# Altium schematic symbol library Resistor - Current Sense.SchLib: 810 symbols (part 2 of 4) (continued)
## CSR2010FTR220 (continued)
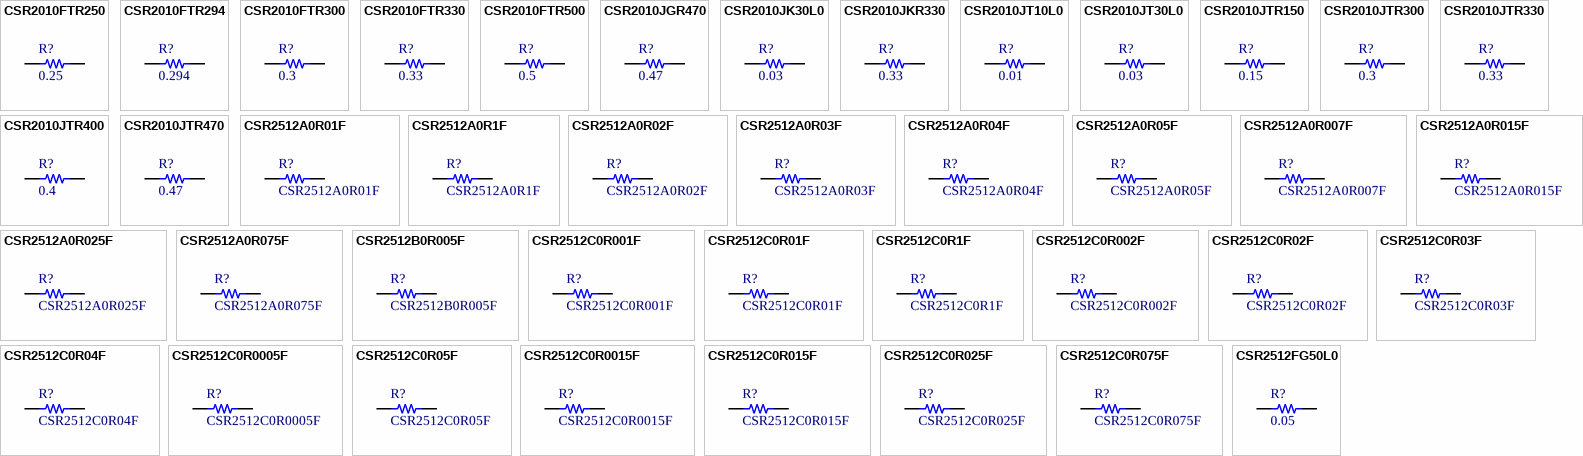
[diagram p6: symbols CSR2010FTR250 to CSR2512FG50L0]

## CSR2010FTR250
designator R?, comment 0.25
RES SMD 0.25 OHM 1% 1W 2010; Part Number: CSR2010FTR250; Manufacturer: Stackpole Electronics Inc.; TemperatureRange: -55C ~ 155C; TemperatureCoefficient: 100ppm/C; Value: 0.25; PartId: 10003; Supplier 1: Digi-Key; Supplier Part Number 1: CSR2010FTR250-ND; ComponentLink1Description: Datasheet; ComponentLink1URL: http://www.seielect.com/catalog/SEI-CSR_CSRN.pdf; ComponentLink2Description: Digi-Key Listing; ComponentLink2URL: https://www.digikey.com/product-detail/en/stackpole-electronics-inc/CSR2010FTR250/CSR2010FTR250-ND/1742345; Tolerance: 1%; PowerRating: 1W; Price: 0.1215; Device Package: 2010 (5025 Metric)
footprint STACKPOLE CSR2010
pins: 1, 2

## CSR2010FTR294
designator R?, comment 0.294
RES SMD 0.294 OHM 1% 1W 2010; Part Number: CSR2010FTR294; Manufacturer: Stackpole Electronics Inc.; TemperatureRange: -55C ~ 155C; TemperatureCoefficient: 100ppm/C; Value: 0.294; PartId: 10006; Supplier 1: Digi-Key; Supplier Part Number 1: CSR2010FTR294TR-ND; ComponentLink1Description: Datasheet; ComponentLink1URL: http://www.seielect.com/catalog/SEI-CSR_CSRN.pdf; ComponentLink2Description: Digi-Key Listing; ComponentLink2URL: https://www.digikey.com/product-detail/en/stackpole-electronics-inc/CSR2010FTR294/CSR2010FTR294TR-ND/2027022; Tolerance: 1%; PowerRating: 1W; Price: 0.1215; Device Package: 2010 (5025 Metric)
footprint STACKPOLE CSR2010
pins: 1, 2

## CSR2010FTR300
designator R?, comment 0.3
RES SMD 0.3 OHM 1% 1W 2010; Part Number: CSR2010FTR300; Manufacturer: Stackpole Electronics Inc.; TemperatureRange: -55C ~ 155C; TemperatureCoefficient: 100ppm/C; Value: 0.3; PartId: 10004; Supplier 1: Digi-Key; Supplier Part Number 1: CSR2010FTR300-ND; ComponentLink1Description: Datasheet; ComponentLink1URL: http://www.seielect.com/catalog/SEI-CSR_CSRN.pdf; ComponentLink2Description: Digi-Key Listing; ComponentLink2URL: https://www.digikey.com/product-detail/en/stackpole-electronics-inc/CSR2010FTR300/CSR2010FTR300-ND/1742347; Tolerance: 1%; PowerRating: 1W; Price: 0.1215; Device Package: 2010 (5025 Metric)
footprint STACKPOLE CSR2010
pins: 1, 2

## CSR2010FTR330
designator R?, comment 0.33
RES SMD 0.33 OHM 1% 1W 2010; Part Number: CSR2010FTR330; Manufacturer: Stackpole Electronics Inc.; TemperatureRange: -55C ~ 155C; TemperatureCoefficient: 100ppm/C; Value: 0.33; PartId: 10005; Supplier 1: Digi-Key; Supplier Part Number 1: CSR2010FTR330-ND; ComponentLink1Description: Datasheet; ComponentLink1URL: http://www.seielect.com/catalog/SEI-CSR_CSRN.pdf; ComponentLink2Description: Digi-Key Listing; ComponentLink2URL: https://www.digikey.com/product-detail/en/stackpole-electronics-inc/CSR2010FTR330/CSR2010FTR330-ND/1742349; Tolerance: 1%; PowerRating: 1W; Price: 0.1215; Device Package: 2010 (5025 Metric)
footprint STACKPOLE CSR2010
pins: 1, 2

## CSR2010FTR500
designator R?, comment 0.5
RES SMD 0.5 OHM 1% 1W 2010; Part Number: CSR2010FTR500; Manufacturer: Stackpole Electronics Inc.; TemperatureRange: -55C ~ 155C; TemperatureCoefficient: 100ppm/C; Value: 0.5; PartId: 9997; Supplier 1: Digi-Key; Supplier Part Number 1: CSR2010FTR500-ND; ComponentLink1Description: Datasheet; ComponentLink1URL: http://www.seielect.com/catalog/SEI-CSR_CSRN.pdf; ComponentLink2Description: Digi-Key Listing; ComponentLink2URL: https://www.digikey.com/product-detail/en/stackpole-electronics-inc/CSR2010FTR500/CSR2010FTR500-ND/1742355; Tolerance: 1%; PowerRating: 1W; Price: 0.0945; Device Package: 2010 (5025 Metric)
footprint STACKPOLE CSR2010
pins: 1, 2

## CSR2010JGR470
designator R?, comment 0.47
RES SMD 0.47 OHM 5% 1W 2010; Part Number: CSR2010JGR470; Manufacturer: Stackpole Electronics Inc.; TemperatureRange: -55C ~ 155C; TemperatureCoefficient: 100ppm/C; Value: 0.47; PartId: 9991; Supplier 1: Digi-Key; Supplier Part Number 1: CSR2010JGR470TR-ND; ComponentLink1Description: Datasheet; ComponentLink1URL: http://www.seielect.com/catalog/SEI-CSR_CSRN.pdf; ComponentLink2Description: Digi-Key Listing; ComponentLink2URL: https://www.digikey.com/product-detail/en/stackpole-electronics-inc/CSR2010JGR470/CSR2010JGR470TR-ND/2027023; Tolerance: 5%; PowerRating: 1W; Price: 0.0675; Device Package: 2010 (5025 Metric)
footprint STACKPOLE CSR2010
pins: 1, 2

## CSR2010JK30L0
designator R?, comment 0.03
RES SMD 0.03 OHM 5% 1W 2010; Part Number: CSR2010JK30L0; Manufacturer: Stackpole Electronics Inc.; TemperatureRange: -55C ~ 155C; Value: 0.03; PartId: 10007; Supplier 1: Digi-Key; Supplier Part Number 1: CSR2010JK30L0-ND; ComponentLink1Description: Datasheet; ComponentLink1URL: http://www.seielect.com/catalog/SEI-CSR_CSRN.pdf; ComponentLink2Description: Digi-Key Listing; ComponentLink2URL: https://www.digikey.com/product-detail/en/stackpole-electronics-inc/CSR2010JK30L0/CSR2010JK30L0-ND/1742322; Tolerance: 5%; PowerRating: 1W; Price: 0.126; Device Package: 2010 (5025 Metric)
footprint STACKPOLE CSR2010
pins: 1, 2

## CSR2010JKR330
designator R?, comment 0.33
RES SMD 0.33 OHM 5% 1W 2010; Part Number: CSR2010JKR330; Manufacturer: Stackpole Electronics Inc.; TemperatureRange: -55C ~ 155C; TemperatureCoefficient: 100ppm/C; Value: 0.33; PartId: 9996; Supplier 1: Digi-Key; Supplier Part Number 1: CSR2010JKR330-ND; ComponentLink1Description: Datasheet; ComponentLink1URL: http://www.seielect.com/catalog/SEI-CSR_CSRN.pdf; ComponentLink2Description: Digi-Key Listing; ComponentLink2URL: https://www.digikey.com/product-detail/en/stackpole-electronics-inc/CSR2010JKR330/CSR2010JKR330-ND/1742350; Tolerance: 5%; PowerRating: 1W; Price: 0.08; Device Package: 2010 (5025 Metric)
footprint STACKPOLE CSR2010
pins: 1, 2

## CSR2010JT10L0
designator R?, comment 0.01
RES SMD 0.01 OHM 5% 1W 2010; Part Number: CSR2010JT10L0; Manufacturer: Stackpole Electronics Inc.; TemperatureRange: -55C ~ 155C; Value: 0.01; PartId: 10012; Supplier 1: Digi-Key; Supplier Part Number 1: CSR2010JT10L0-ND; ComponentLink1Description: Datasheet; ComponentLink1URL: http://www.seielect.com/catalog/SEI-CSR_CSRN.pdf; ComponentLink2Description: Digi-Key Listing; ComponentLink2URL: https://www.digikey.com/product-detail/en/stackpole-electronics-inc/CSR2010JT10L0/CSR2010JT10L0-ND/1742312; Tolerance: 5%; PowerRating: 1W; Price: 0.1474; Device Package: 2010 (5025 Metric)
footprint STACKPOLE CSR2010
pins: 1, 2

## CSR2010JT30L0
designator R?, comment 0.03
RES SMD 0.03 OHM 5% 1W 2010; Part Number: CSR2010JT30L0; Manufacturer: Stackpole Electronics Inc.; TemperatureRange: -55C ~ 155C; Value: 0.03; PartId: 10000; Supplier 1: Digi-Key; Supplier Part Number 1: CSR2010JT30L0-ND; ComponentLink1Description: Datasheet; ComponentLink1URL: http://www.seielect.com/catalog/SEI-CSR_CSRN.pdf; ComponentLink2Description: Digi-Key Listing; ComponentLink2URL: https://www.digikey.com/product-detail/en/stackpole-electronics-inc/CSR2010JT30L0/CSR2010JT30L0-ND/1742323; Tolerance: 5%; PowerRating: 1W; Price: 0.1215; Device Package: 2010 (5025 Metric)
footprint STACKPOLE CSR2010
pins: 1, 2

## CSR2010JTR150
designator R?, comment 0.15
RES SMD 0.15 OHM 5% 1W 2010; Part Number: CSR2010JTR150; Manufacturer: Stackpole Electronics Inc.; TemperatureRange: -55C ~ 155C; TemperatureCoefficient: 100ppm/C; Value: 0.15; PartId: 9992; Supplier 1: Digi-Key; Supplier Part Number 1: CSR2010JTR150-ND; ComponentLink1Description: Datasheet; ComponentLink1URL: http://www.seielect.com/catalog/SEI-CSR_CSRN.pdf; ComponentLink2Description: Digi-Key Listing; ComponentLink2URL: https://www.digikey.com/product-detail/en/stackpole-electronics-inc/CSR2010JTR150/CSR2010JTR150-ND/1742340; Tolerance: 5%; PowerRating: 1W; Price: 0.075; Device Package: 2010 (5025 Metric)
footprint STACKPOLE CSR2010
pins: 1, 2

## CSR2010JTR300
designator R?, comment 0.3
RES SMD 0.3 OHM 5% 1W 2010; Part Number: CSR2010JTR300; Manufacturer: Stackpole Electronics Inc.; TemperatureRange: -55C ~ 155C; TemperatureCoefficient: 100ppm/C; Value: 0.3; PartId: 9989; Supplier 1: Digi-Key; Supplier Part Number 1: CSR2010JTR300TR-ND; ComponentLink1Description: Datasheet; ComponentLink1URL: http://www.seielect.com/catalog/SEI-CSR_CSRN.pdf; ComponentLink2Description: Digi-Key Listing; ComponentLink2URL: https://www.digikey.com/product-detail/en/stackpole-electronics-inc/CSR2010JTR300/CSR2010JTR300TR-ND/1742348; Tolerance: 5%; PowerRating: 1W; Price: 0.075; Device Package: 2010 (5025 Metric)
footprint STACKPOLE CSR2010
pins: 1, 2

## CSR2010JTR330
designator R?, comment 0.33
RES SMD 0.33 OHM 5% 1W 2010; Part Number: CSR2010JTR330; Manufacturer: Stackpole Electronics Inc.; TemperatureRange: -55C ~ 155C; TemperatureCoefficient: 100ppm/C; Value: 0.33; PartId: 9993; Supplier 1: Digi-Key; Supplier Part Number 1: CSR2010JTR330-ND; ComponentLink1Description: Datasheet; ComponentLink1URL: http://www.seielect.com/catalog/SEI-CSR_CSRN.pdf; ComponentLink2Description: Digi-Key Listing; ComponentLink2URL: https://www.digikey.com/product-detail/en/stackpole-electronics-inc/CSR2010JTR330/CSR2010JTR330-ND/1742351; Tolerance: 5%; PowerRating: 1W; Price: 0.075; Device Package: 2010 (5025 Metric)
footprint STACKPOLE CSR2010
pins: 1, 2

## CSR2010JTR400
designator R?, comment 0.4
RES SMD 0.4 OHM 5% 1W 2010; Part Number: CSR2010JTR400; Manufacturer: Stackpole Electronics Inc.; TemperatureRange: -55C ~ 155C; TemperatureCoefficient: 100ppm/C; Value: 0.4; PartId: 9994; Supplier 1: Digi-Key; Supplier Part Number 1: CSR2010JTR400-ND; ComponentLink1Description: Datasheet; ComponentLink1URL: http://www.seielect.com/catalog/SEI-CSR_CSRN.pdf; ComponentLink2Description: Digi-Key Listing; ComponentLink2URL: https://www.digikey.com/product-detail/en/stackpole-electronics-inc/CSR2010JTR400/CSR2010JTR400-ND/1742352; Tolerance: 5%; PowerRating: 1W; Price: 0.075; Device Package: 2010 (5025 Metric)
footprint STACKPOLE CSR2010
pins: 1, 2

## CSR2010JTR470
designator R?, comment 0.47
RES SMD 0.47 OHM 5% 1W 2010; Part Number: CSR2010JTR470; Manufacturer: Stackpole Electronics Inc.; TemperatureRange: -55C ~ 155C; TemperatureCoefficient: 100ppm/C; Value: 0.47; PartId: 9995; Supplier 1: Digi-Key; Supplier Part Number 1: CSR2010JTR470-ND; ComponentLink1Description: Datasheet; ComponentLink1URL: http://www.seielect.com/catalog/SEI-CSR_CSRN.pdf; ComponentLink2Description: Digi-Key Listing; ComponentLink2URL: https://www.digikey.com/product-detail/en/stackpole-electronics-inc/CSR2010JTR470/CSR2010JTR470-ND/1742353; Tolerance: 5%; PowerRating: 1W; Price: 0.075; Device Package: 2010 (5025 Metric)
footprint STACKPOLE CSR2010
pins: 1, 2

## CSR2512A0R01F
designator R?
RES SMD 0.01 OHM 1% 2W 2512; Manufacturer: Riedon; Value: 0.01; TemperatureRange: -55C ~ 170C; TemperatureCoefficient: 50ppm/C; Part Number: CSR2512A0R01F; PartId: 21410; Supplier 1: Digi-Key; Supplier Part Number 1: 696-1180-2-ND; ComponentLink1Description: Datasheet; ComponentLink1URL: http://riedon.com/media/pdf/CSR.pdf; ComponentLink2Description: Digi-Key Listing; ComponentLink2URL: https://www.digikey.com/product-detail/en/riedon/CSR2512A0R01F/696-1180-2-ND/2813300; Tolerance: 1%; PowerRating: 2W; Price: 0.1928; Device Package: 2512 (6432 Metric)
footprint STACKPOLE CSR2512
pins: 1, 2

## CSR2512A0R1F
designator R?
RES SMD 0.1 OHM 1% 2W 2512; Manufacturer: Riedon; Value: 0.1; TemperatureRange: -55C ~ 170C; TemperatureCoefficient: 50ppm/C; Part Number: CSR2512A0R1F; PartId: 21362; Supplier 1: Digi-Key; Supplier Part Number 1: 696-1671-2-ND; ComponentLink1Description: Datasheet; ComponentLink1URL: http://riedon.com/media/pdf/CSR.pdf; ComponentLink2Description: Digi-Key Listing; ComponentLink2URL: https://www.digikey.com/product-detail/en/riedon/CSR2512A0R1F/696-1671-2-ND/5723633; Tolerance: 1%; PowerRating: 2W; Price: 0.1729; Device Package: 2512 (6432 Metric)
footprint STACKPOLE CSR2512
pins: 1, 2

## CSR2512A0R02F
designator R?
RES SMD 0.02 OHM 1% 2W 2512; Manufacturer: Riedon; Value: 0.02; TemperatureRange: -55C ~ 170C; TemperatureCoefficient: 50ppm/C; Part Number: CSR2512A0R02F; PartId: 21356; Supplier 1: Digi-Key; Supplier Part Number 1: 696-1665-2-ND; ComponentLink1Description: Datasheet; ComponentLink1URL: http://riedon.com/media/pdf/CSR.pdf; ComponentLink2Description: Digi-Key Listing; ComponentLink2URL: https://www.digikey.com/product-detail/en/riedon/CSR2512A0R02F/696-1665-2-ND/5723627; Tolerance: 1%; PowerRating: 2W; Price: 0.1729; Device Package: 2512 (6432 Metric)
footprint STACKPOLE CSR2512
pins: 1, 2

## CSR2512A0R03F
designator R?
RES SMD 0.03 OHM 1% 2W 2512; Manufacturer: Riedon; Value: 0.03; TemperatureRange: -55C ~ 170C; TemperatureCoefficient: 50ppm/C; Part Number: CSR2512A0R03F; PartId: 21378; Supplier 1: Digi-Key; Supplier Part Number 1: 696-1667-2-ND; ComponentLink1Description: Datasheet; ComponentLink1URL: http://riedon.com/media/pdf/CSR.pdf; ComponentLink2Description: Digi-Key Listing; ComponentLink2URL: https://www.digikey.com/product-detail/en/riedon/CSR2512A0R03F/696-1667-2-ND/5723629; Tolerance: 1%; PowerRating: 2W; Price: 0.1729; Device Package: 2512 (6432 Metric)
footprint STACKPOLE CSR2512
pins: 1, 2

## CSR2512A0R04F
designator R?
RES SMD 0.04 OHM 1% 2W 2512; Manufacturer: Riedon; Value: 0.04; TemperatureRange: -55C ~ 170C; TemperatureCoefficient: 50ppm/C; Part Number: CSR2512A0R04F; PartId: 21379; Supplier 1: Digi-Key; Supplier Part Number 1: 696-1668-2-ND; ComponentLink1Description: Datasheet; ComponentLink1URL: http://riedon.com/media/pdf/CSR.pdf; ComponentLink2Description: Digi-Key Listing; ComponentLink2URL: https://www.digikey.com/product-detail/en/riedon/CSR2512A0R04F/696-1668-2-ND/5723630; Tolerance: 1%; PowerRating: 2W; Price: 0.1729; Device Package: 2512 (6432 Metric)
footprint STACKPOLE CSR2512
pins: 1, 2

## CSR2512A0R05F
designator R?
RES SMD 0.05 OHM 1% 2W 2512; Manufacturer: Riedon; Value: 0.05; TemperatureRange: -55C ~ 170C; TemperatureCoefficient: 50ppm/C; Part Number: CSR2512A0R05F; PartId: 21361; Supplier 1: Digi-Key; Supplier Part Number 1: 696-1669-2-ND; ComponentLink1Description: Datasheet; ComponentLink1URL: http://riedon.com/media/pdf/CSR.pdf; ComponentLink2Description: Digi-Key Listing; ComponentLink2URL: https://www.digikey.com/product-detail/en/riedon/CSR2512A0R05F/696-1669-2-ND/5723631; Tolerance: 1%; PowerRating: 2W; Price: 0.1729; Device Package: 2512 (6432 Metric)
footprint STACKPOLE CSR2512
pins: 1, 2

## CSR2512A0R007F
designator R?
RES SMD 0.007 OHM 1% 2W 2512; Manufacturer: Riedon; Value: 0.007; TemperatureRange: -55C ~ 170C; TemperatureCoefficient: 50ppm/C; Part Number: CSR2512A0R007F; PartId: 21411; Supplier 1: Digi-Key; Supplier Part Number 1: 696-1179-2-ND; ComponentLink1Description: Datasheet; ComponentLink1URL: http://riedon.com/media/pdf/CSR.pdf; ComponentLink2Description: Digi-Key Listing; ComponentLink2URL: https://www.digikey.com/product-detail/en/riedon/CSR2512A0R007F/696-1179-2-ND/2813299; Tolerance: 1%; PowerRating: 2W; Price: 0.1928; Device Package: 2512 (6432 Metric)
footprint STACKPOLE CSR2512
pins: 1, 2

## CSR2512A0R015F
designator R?
RES SMD 0.015 OHM 1% 2W 2512; Manufacturer: Riedon; Value: 0.015; TemperatureRange: -55C ~ 170C; TemperatureCoefficient: 50ppm/C; Part Number: CSR2512A0R015F; PartId: 21381; Supplier 1: Digi-Key; Supplier Part Number 1: 696-1664-2-ND; ComponentLink1Description: Datasheet; ComponentLink1URL: http://riedon.com/media/pdf/CSR.pdf; ComponentLink2Description: Digi-Key Listing; ComponentLink2URL: https://www.digikey.com/product-detail/en/riedon/CSR2512A0R015F/696-1664-2-ND/5723626; Tolerance: 1%; PowerRating: 2W; Price: 0.1729; Device Package: 2512 (6432 Metric)
footprint STACKPOLE CSR2512
pins: 1, 2

## CSR2512A0R025F
designator R?
RES SMD 0.025 OHM 1% 2W 2512; Manufacturer: Riedon; Value: 0.025; TemperatureRange: -55C ~ 170C; TemperatureCoefficient: 50ppm/C; Part Number: CSR2512A0R025F; PartId: 21377; Supplier 1: Digi-Key; Supplier Part Number 1: 696-1666-2-ND; ComponentLink1Description: Datasheet; ComponentLink1URL: http://riedon.com/media/pdf/CSR.pdf; ComponentLink2Description: Digi-Key Listing; ComponentLink2URL: https://www.digikey.com/product-detail/en/riedon/CSR2512A0R025F/696-1666-2-ND/5723628; Tolerance: 1%; PowerRating: 2W; Price: 0.1729; Device Package: 2512 (6432 Metric)
footprint STACKPOLE CSR2512
pins: 1, 2

## CSR2512A0R075F
designator R?
RES SMD 0.075 OHM 1% 2W 2512; Manufacturer: Riedon; Value: 0.075; TemperatureRange: -55C ~ 170C; TemperatureCoefficient: 50ppm/C; Part Number: CSR2512A0R075F; PartId: 21382; Supplier 1: Digi-Key; Supplier Part Number 1: 696-1670-2-ND; ComponentLink1Description: Datasheet; ComponentLink1URL: http://riedon.com/media/pdf/CSR.pdf; ComponentLink2Description: Digi-Key Listing; ComponentLink2URL: https://www.digikey.com/product-detail/en/riedon/CSR2512A0R075F/696-1670-2-ND/5723632; Tolerance: 1%; PowerRating: 2W; Price: 0.1729; Device Package: 2512 (6432 Metric)
footprint STACKPOLE CSR2512
pins: 1, 2

## CSR2512B0R005F
designator R?
RES SMD 0.005 OHM 1% 2.5W 2512; Manufacturer: Riedon; Value: 0.005; TemperatureRange: -55C ~ 170C; TemperatureCoefficient: 50ppm/C; Part Number: CSR2512B0R005F; PartId: 21408; Supplier 1: Digi-Key; Supplier Part Number 1: 696-1182-2-ND; ComponentLink1Description: Datasheet; ComponentLink1URL: http://riedon.com/media/pdf/CSR.pdf; ComponentLink2Description: Digi-Key Listing; ComponentLink2URL: https://www.digikey.com/product-detail/en/riedon/CSR2512B0R005F/696-1182-2-ND/2813298; Tolerance: 1%; PowerRating: 2.5W; Price: 0.1928; Device Package: 2512 (6432 Metric)
footprint STACKPOLE CSR2512
pins: 1, 2

## CSR2512C0R001F
designator R?
RES SMD 0.001 OHM 1% 3W 2512; Manufacturer: Riedon; Value: 0.001; TemperatureRange: -55C ~ 170C; TemperatureCoefficient: 50ppm/C; Part Number: CSR2512C0R001F; PartId: 21406; Supplier 1: Digi-Key; Supplier Part Number 1: 696-1185-2-ND; ComponentLink1Description: Datasheet; ComponentLink1URL: http://riedon.com/media/pdf/CSR.pdf; ComponentLink2Description: Digi-Key Listing; ComponentLink2URL: https://www.digikey.com/product-detail/en/riedon/CSR2512C0R001F/696-1185-2-ND/2813294; Tolerance: 1%; PowerRating: 3W; Price: 0.1928; Device Package: 2512 (6432 Metric)
footprint STACKPOLE CSR2512
pins: 1, 2

## CSR2512C0R01F
designator R?
RES SMD 0.01 OHM 1% 3W 2512; Manufacturer: Riedon; Value: 0.01; TemperatureRange: -55C ~ 170C; TemperatureCoefficient: 75ppm/C; Part Number: CSR2512C0R01F; PartId: 21359; Supplier 1: Digi-Key; Supplier Part Number 1: 696-1672-2-ND; ComponentLink1Description: Datasheet; ComponentLink1URL: http://riedon.com/media/pdf/CSR.pdf; ComponentLink2Description: Digi-Key Listing; ComponentLink2URL: https://www.digikey.com/product-detail/en/riedon/CSR2512C0R01F/696-1672-2-ND/5723634; Tolerance: 1%; PowerRating: 3W; Price: 0.1729; Device Package: 2512 (6432 Metric)
footprint STACKPOLE CSR2512
pins: 1, 2

## CSR2512C0R1F
designator R?
RES SMD 0.1 OHM 1% 3W 2512; Manufacturer: Riedon; Value: 0.1; TemperatureRange: -55C ~ 170C; TemperatureCoefficient: 50ppm/C; Part Number: CSR2512C0R1F; PartId: 21357; Supplier 1: Digi-Key; Supplier Part Number 1: 696-1680-2-ND; ComponentLink1Description: Datasheet; ComponentLink1URL: http://riedon.com/media/pdf/CSR.pdf; ComponentLink2Description: Digi-Key Listing; ComponentLink2URL: https://www.digikey.com/product-detail/en/riedon/CSR2512C0R1F/696-1680-2-ND/5723642; Tolerance: 1%; PowerRating: 3W; Price: 0.1729; Device Package: 2512 (6432 Metric)
footprint STACKPOLE CSR2512
pins: 1, 2

## CSR2512C0R002F
designator R?
RES SMD 0.002 OHM 1% 3W 2512; Manufacturer: Riedon; Value: 0.002; TemperatureRange: -55C ~ 170C; TemperatureCoefficient: 50ppm/C; Part Number: CSR2512C0R002F; PartId: 21407; Supplier 1: Digi-Key; Supplier Part Number 1: 696-1186-2-ND; ComponentLink1Description: Datasheet; ComponentLink1URL: http://riedon.com/media/pdf/CSR.pdf; ComponentLink2Description: Digi-Key Listing; ComponentLink2URL: https://www.digikey.com/product-detail/en/riedon/CSR2512C0R002F/696-1186-2-ND/2813296; Tolerance: 1%; PowerRating: 3W; Price: 0.1928; Device Package: 2512 (6432 Metric)
footprint STACKPOLE CSR2512
pins: 1, 2

## CSR2512C0R02F
designator R?
RES SMD 0.02 OHM 1% 3W 2512; Manufacturer: Riedon; Value: 0.02; TemperatureRange: -55C ~ 170C; TemperatureCoefficient: 50ppm/C; Part Number: CSR2512C0R02F; PartId: 21360; Supplier 1: Digi-Key; Supplier Part Number 1: 696-1674-2-ND; ComponentLink1Description: Datasheet; ComponentLink1URL: http://riedon.com/media/pdf/CSR.pdf; ComponentLink2Description: Digi-Key Listing; ComponentLink2URL: https://www.digikey.com/product-detail/en/riedon/CSR2512C0R02F/696-1674-2-ND/5723636; Tolerance: 1%; PowerRating: 3W; Price: 0.1729; Device Package: 2512 (6432 Metric)
footprint STACKPOLE CSR2512
pins: 1, 2

## CSR2512C0R03F
designator R?
RES SMD 0.03 OHM 1% 3W 2512; Manufacturer: Riedon; Value: 0.03; TemperatureRange: -55C ~ 170C; TemperatureCoefficient: 50ppm/C; Part Number: CSR2512C0R03F; PartId: 21364; Supplier 1: Digi-Key; Supplier Part Number 1: 696-1676-2-ND; ComponentLink1Description: Datasheet; ComponentLink1URL: http://riedon.com/media/pdf/CSR.pdf; ComponentLink2Description: Digi-Key Listing; ComponentLink2URL: https://www.digikey.com/product-detail/en/riedon/CSR2512C0R03F/696-1676-2-ND/5723638; Tolerance: 1%; PowerRating: 3W; Price: 0.1729; Device Package: 2512 (6432 Metric)
footprint STACKPOLE CSR2512
pins: 1, 2

## CSR2512C0R04F
designator R?
RES SMD 0.04 OHM 1% 3W 2512; Manufacturer: Riedon; Value: 0.04; TemperatureRange: -55C ~ 170C; TemperatureCoefficient: 50ppm/C; Part Number: CSR2512C0R04F; PartId: 21383; Supplier 1: Digi-Key; Supplier Part Number 1: 696-1677-2-ND; ComponentLink1Description: Datasheet; ComponentLink1URL: http://riedon.com/media/pdf/CSR.pdf; ComponentLink2Description: Digi-Key Listing; ComponentLink2URL: https://www.digikey.com/product-detail/en/riedon/CSR2512C0R04F/696-1677-2-ND/5723639; Tolerance: 1%; PowerRating: 3W; Price: 0.1729; Device Package: 2512 (6432 Metric)
footprint STACKPOLE CSR2512
pins: 1, 2

## CSR2512C0R0005F
designator R?
RES SMD 0.0005 OHM 1% 3W 2512; Manufacturer: Riedon; Value: 0.0005; TemperatureRange: -55C ~ 170C; TemperatureCoefficient: 100ppm/C; Part Number: CSR2512C0R0005F; PartId: 21405; Supplier 1: Digi-Key; Supplier Part Number 1: 696-1183-2-ND; ComponentLink1Description: Datasheet; ComponentLink1URL: http://riedon.com/media/pdf/CSR.pdf; ComponentLink2Description: Digi-Key Listing; ComponentLink2URL: https://www.digikey.com/product-detail/en/riedon/CSR2512C0R0005F/696-1183-2-ND/2813293; Tolerance: 1%; PowerRating: 3W; Price: 0.1928; Device Package: 2512 (6432 Metric)
footprint STACKPOLE CSR2512
pins: 1, 2

## CSR2512C0R05F
designator R?
RES SMD 0.05 OHM 1% 3W 2512; Manufacturer: Riedon; Value: 0.05; TemperatureRange: -55C ~ 170C; TemperatureCoefficient: 50ppm/C; Part Number: CSR2512C0R05F; PartId: 21365; Supplier 1: Digi-Key; Supplier Part Number 1: 696-1678-2-ND; ComponentLink1Description: Datasheet; ComponentLink1URL: http://riedon.com/media/pdf/CSR.pdf; ComponentLink2Description: Digi-Key Listing; ComponentLink2URL: https://www.digikey.com/product-detail/en/riedon/CSR2512C0R05F/696-1678-2-ND/5723640; Tolerance: 1%; PowerRating: 3W; Price: 0.1729; Device Package: 2512 (6432 Metric)
footprint STACKPOLE CSR2512
pins: 1, 2

## CSR2512C0R0015F
designator R?
RES SMD 0.0015 OHM 1% 3W 2512; Manufacturer: Riedon; Value: 0.0015; TemperatureRange: -55C ~ 170C; TemperatureCoefficient: 50ppm/C; Part Number: CSR2512C0R0015F; PartId: 21409; Supplier 1: Digi-Key; Supplier Part Number 1: 696-1184-2-ND; ComponentLink1Description: Datasheet; ComponentLink1URL: http://riedon.com/media/pdf/CSR.pdf; ComponentLink2Description: Digi-Key Listing; ComponentLink2URL: https://www.digikey.com/product-detail/en/riedon/CSR2512C0R0015F/696-1184-2-ND/2813295; Tolerance: 1%; PowerRating: 3W; Price: 0.1928; Device Package: 2512 (6432 Metric)
footprint STACKPOLE CSR2512
pins: 1, 2

## CSR2512C0R015F
designator R?
RES SMD 0.015 OHM 1% 3W 2512; Manufacturer: Riedon; Value: 0.015; TemperatureRange: -55C ~ 170C; TemperatureCoefficient: 50ppm/C; Part Number: CSR2512C0R015F; PartId: 21380; Supplier 1: Digi-Key; Supplier Part Number 1: 696-1673-2-ND; ComponentLink1Description: Datasheet; ComponentLink1URL: http://riedon.com/media/pdf/CSR.pdf; ComponentLink2Description: Digi-Key Listing; ComponentLink2URL: https://www.digikey.com/product-detail/en/riedon/CSR2512C0R015F/696-1673-2-ND/5723635; Tolerance: 1%; PowerRating: 3W; Price: 0.1729; Device Package: 2512 (6432 Metric)
footprint STACKPOLE CSR2512
pins: 1, 2

## CSR2512C0R025F
designator R?
RES SMD 0.025 OHM 1% 3W 2512; Manufacturer: Riedon; Value: 0.025; TemperatureRange: -55C ~ 170C; TemperatureCoefficient: 50ppm/C; Part Number: CSR2512C0R025F; PartId: 21363; Supplier 1: Digi-Key; Supplier Part Number 1: 696-1675-2-ND; ComponentLink1Description: Datasheet; ComponentLink1URL: http://riedon.com/media/pdf/CSR.pdf; ComponentLink2Description: Digi-Key Listing; ComponentLink2URL: https://www.digikey.com/product-detail/en/riedon/CSR2512C0R025F/696-1675-2-ND/5723637; Tolerance: 1%; PowerRating: 3W; Price: 0.1729; Device Package: 2512 (6432 Metric)
footprint STACKPOLE CSR2512
pins: 1, 2

## CSR2512C0R075F
designator R?
RES SMD 0.075 OHM 1% 3W 2512; Manufacturer: Riedon; Value: 0.075; TemperatureRange: -55C ~ 170C; TemperatureCoefficient: 50ppm/C; Part Number: CSR2512C0R075F; PartId: 21384; Supplier 1: Digi-Key; Supplier Part Number 1: 696-1679-2-ND; ComponentLink1Description: Datasheet; ComponentLink1URL: http://riedon.com/media/pdf/CSR.pdf; ComponentLink2Description: Digi-Key Listing; ComponentLink2URL: https://www.digikey.com/product-detail/en/riedon/CSR2512C0R075F/696-1679-2-ND/5723641; Tolerance: 1%; PowerRating: 3W; Price: 0.1729; Device Package: 2512 (6432 Metric)
footprint STACKPOLE CSR2512
pins: 1, 2

## CSR2512FG50L0
designator R?, comment 0.05
RES SMD 0.05 OHM 1% 2W 2512; Part Number: CSR2512FG50L0; Manufacturer: Stackpole Electronics Inc.; TemperatureRange: -55C ~ 155C; TemperatureCoefficient: 200ppm/C; Value: 0.05; PartId: 10071; Supplier 1: Digi-Key; Supplier Part Number 1: CSR2512FG50L0TR-ND; ComponentLink1Description: Datasheet; ComponentLink1URL: http://www.seielect.com/catalog/SEI-CSR_CSRN.pdf; ComponentLink2Description: Digi-Key Listing; ComponentLink2URL: https://www.digikey.com/product-detail/en/stackpole-electronics-inc/CSR2512FG50L0/CSR2512FG50L0TR-ND/2027025; Tolerance: 1%; PowerRating: 2W; Price: 0.169; Device Package: 2512 (6432 Metric)
footprint STACKPOLE CSR2512
pins: 1, 2

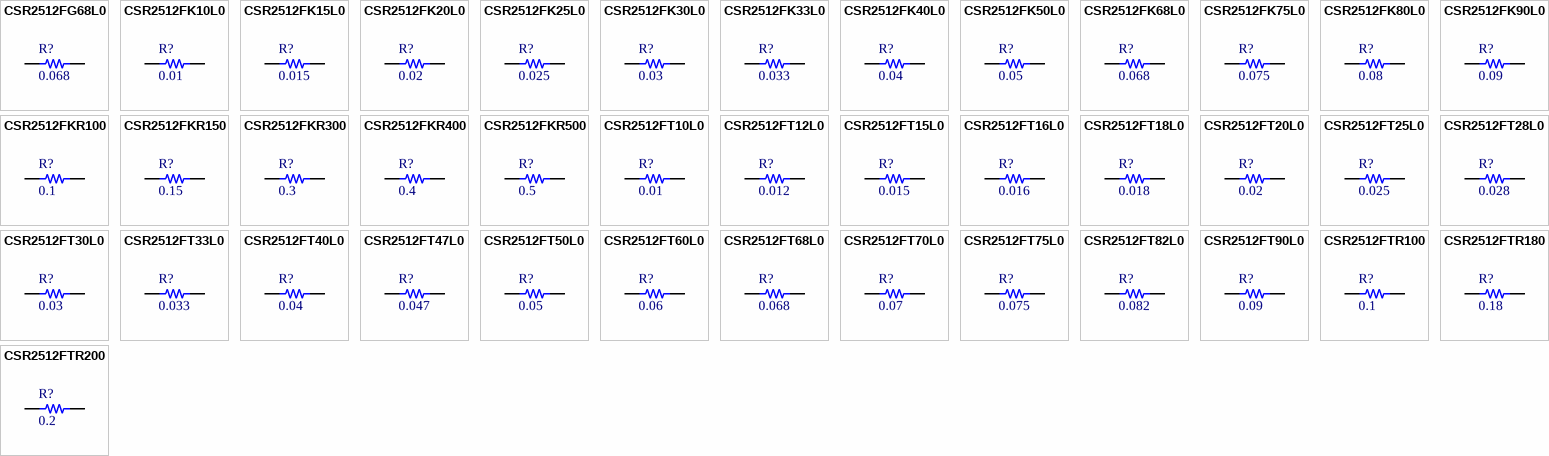
[diagram p7: symbols CSR2512FG68L0 to CSR2512FTR200]

## CSR2512FG68L0
designator R?, comment 0.068
RES SMD 0.068 OHM 1% 2W 2512; Part Number: CSR2512FG68L0; Manufacturer: Stackpole Electronics Inc.; TemperatureRange: -55C ~ 155C; TemperatureCoefficient: 200ppm/C; Value: 0.068; PartId: 10093; Supplier 1: Digi-Key; Supplier Part Number 1: CSR2512FG68L0TR-ND; ComponentLink1Description: Datasheet; ComponentLink1URL: http://www.seielect.com/catalog/SEI-CSR_CSRN.pdf; ComponentLink2Description: Digi-Key Listing; ComponentLink2URL: https://www.digikey.com/product-detail/en/stackpole-electronics-inc/CSR2512FG68L0/CSR2512FG68L0TR-ND/2027026; Tolerance: 1%; PowerRating: 2W; Price: 0; Device Package: 2512 (6432 Metric)
footprint STACKPOLE CSR2512
pins: 1, 2

## CSR2512FK10L0
designator R?, comment 0.01
RES SMD 0.01 OHM 1% 2W 2512; Part Number: CSR2512FK10L0; Manufacturer: Stackpole Electronics Inc.; TemperatureRange: -55C ~ 155C; TemperatureCoefficient: 200ppm/C; Value: 0.01; PartId: 10090; Supplier 1: Digi-Key; Supplier Part Number 1: CSR2512FK10L0-ND; ComponentLink1Description: Datasheet; ComponentLink1URL: http://www.seielect.com/catalog/SEI-CSR_CSRN.pdf; ComponentLink2Description: Digi-Key Listing; ComponentLink2URL: https://www.digikey.com/product-detail/en/stackpole-electronics-inc/CSR2512FK10L0/CSR2512FK10L0-ND/1742503; Tolerance: 1%; PowerRating: 2W; Price: 0.22; Device Package: 2512 (6432 Metric)
footprint STACKPOLE CSR2512
pins: 1, 2

## CSR2512FK15L0
designator R?, comment 0.015
RES SMD 0.015 OHM 1% 2W 2512; Part Number: CSR2512FK15L0; Manufacturer: Stackpole Electronics Inc.; TemperatureRange: -55C ~ 155C; TemperatureCoefficient: 200ppm/C; Value: 0.015; PartId: 10091; Supplier 1: Digi-Key; Supplier Part Number 1: CSR2512FK15L0-ND; ComponentLink1Description: Datasheet; ComponentLink1URL: http://www.seielect.com/catalog/SEI-CSR_CSRN.pdf; ComponentLink2Description: Digi-Key Listing; ComponentLink2URL: https://www.digikey.com/product-detail/en/stackpole-electronics-inc/CSR2512FK15L0/CSR2512FK15L0-ND/1742506; Tolerance: 1%; PowerRating: 2W; Price: 0.22; Device Package: 2512 (6432 Metric)
footprint STACKPOLE CSR2512
pins: 1, 2

## CSR2512FK20L0
designator R?, comment 0.02
RES SMD 0.02 OHM 1% 2W 2512; Part Number: CSR2512FK20L0; Manufacturer: Stackpole Electronics Inc.; TemperatureRange: -55C ~ 155C; TemperatureCoefficient: 200ppm/C; Value: 0.02; PartId: 10092; Supplier 1: Digi-Key; Supplier Part Number 1: CSR2512FK20L0-ND; ComponentLink1Description: Datasheet; ComponentLink1URL: http://www.seielect.com/catalog/SEI-CSR_CSRN.pdf; ComponentLink2Description: Digi-Key Listing; ComponentLink2URL: https://www.digikey.com/product-detail/en/stackpole-electronics-inc/CSR2512FK20L0/CSR2512FK20L0-ND/1742514; Tolerance: 1%; PowerRating: 2W; Price: 0.22; Device Package: 2512 (6432 Metric)
footprint STACKPOLE CSR2512
pins: 1, 2

## CSR2512FK25L0
designator R?, comment 0.025
RES SMD 0.025 OHM 1% 2W 2512; Part Number: CSR2512FK25L0; Manufacturer: Stackpole Electronics Inc.; TemperatureRange: -55C ~ 155C; TemperatureCoefficient: 200ppm/C; Value: 0.025; PartId: 10079; Supplier 1: Digi-Key; Supplier Part Number 1: CSR2512FK25L0-ND; ComponentLink1Description: Datasheet; ComponentLink1URL: http://www.seielect.com/catalog/SEI-CSR_CSRN.pdf; ComponentLink2Description: Digi-Key Listing; ComponentLink2URL: https://www.digikey.com/product-detail/en/stackpole-electronics-inc/CSR2512FK25L0/CSR2512FK25L0-ND/1742516; Tolerance: 1%; PowerRating: 2W; Price: 0.1787; Device Package: 2512 (6432 Metric)
footprint STACKPOLE CSR2512
pins: 1, 2

## CSR2512FK30L0
designator R?, comment 0.03
RES SMD 0.03 OHM 1% 2W 2512; Part Number: CSR2512FK30L0; Manufacturer: Stackpole Electronics Inc.; TemperatureRange: -55C ~ 155C; TemperatureCoefficient: 200ppm/C; Value: 0.03; PartId: 10080; Supplier 1: Digi-Key; Supplier Part Number 1: CSR2512FK30L0-ND; ComponentLink1Description: Datasheet; ComponentLink1URL: http://www.seielect.com/catalog/SEI-CSR_CSRN.pdf; ComponentLink2Description: Digi-Key Listing; ComponentLink2URL: https://www.digikey.com/product-detail/en/stackpole-electronics-inc/CSR2512FK30L0/CSR2512FK30L0-ND/1742519; Tolerance: 1%; PowerRating: 2W; Price: 0.1787; Device Package: 2512 (6432 Metric)
footprint STACKPOLE CSR2512
pins: 1, 2

## CSR2512FK33L0
designator R?, comment 0.033
RES SMD 0.033 OHM 1% 2W 2512; Part Number: CSR2512FK33L0; Manufacturer: Stackpole Electronics Inc.; TemperatureRange: -55C ~ 155C; TemperatureCoefficient: 200ppm/C; Value: 0.033; PartId: 10081; Supplier 1: Digi-Key; Supplier Part Number 1: CSR2512FK33L0-ND; ComponentLink1Description: Datasheet; ComponentLink1URL: http://www.seielect.com/catalog/SEI-CSR_CSRN.pdf; ComponentLink2Description: Digi-Key Listing; ComponentLink2URL: https://www.digikey.com/product-detail/en/stackpole-electronics-inc/CSR2512FK33L0/CSR2512FK33L0-ND/1742521; Tolerance: 1%; PowerRating: 2W; Price: 0.1787; Device Package: 2512 (6432 Metric)
footprint STACKPOLE CSR2512
pins: 1, 2

## CSR2512FK40L0
designator R?, comment 0.04
RES SMD 0.04 OHM 1% 2W 2512; Part Number: CSR2512FK40L0; Manufacturer: Stackpole Electronics Inc.; TemperatureRange: -55C ~ 155C; TemperatureCoefficient: 200ppm/C; Value: 0.04; PartId: 10082; Supplier 1: Digi-Key; Supplier Part Number 1: CSR2512FK40L0-ND; ComponentLink1Description: Datasheet; ComponentLink1URL: http://www.seielect.com/catalog/SEI-CSR_CSRN.pdf; ComponentLink2Description: Digi-Key Listing; ComponentLink2URL: https://www.digikey.com/product-detail/en/stackpole-electronics-inc/CSR2512FK40L0/CSR2512FK40L0-ND/1742526; Tolerance: 1%; PowerRating: 2W; Price: 0.1787; Device Package: 2512 (6432 Metric)
footprint STACKPOLE CSR2512
pins: 1, 2

## CSR2512FK50L0
designator R?, comment 0.05
RES SMD 0.05 OHM 1% 2W 2512; Part Number: CSR2512FK50L0; Manufacturer: Stackpole Electronics Inc.; TemperatureRange: -55C ~ 155C; TemperatureCoefficient: 200ppm/C; Value: 0.05; PartId: 10083; Supplier 1: Digi-Key; Supplier Part Number 1: CSR2512FK50L0-ND; ComponentLink1Description: Datasheet; ComponentLink1URL: http://www.seielect.com/catalog/SEI-CSR_CSRN.pdf; ComponentLink2Description: Digi-Key Listing; ComponentLink2URL: https://www.digikey.com/product-detail/en/stackpole-electronics-inc/CSR2512FK50L0/CSR2512FK50L0-ND/1742529; Tolerance: 1%; PowerRating: 2W; Price: 0.1787; Device Package: 2512 (6432 Metric)
footprint STACKPOLE CSR2512
pins: 1, 2

## CSR2512FK68L0
designator R?, comment 0.068
RES SMD 0.068 OHM 1% 2W 2512; Part Number: CSR2512FK68L0; Manufacturer: Stackpole Electronics Inc.; TemperatureRange: -55C ~ 155C; TemperatureCoefficient: 200ppm/C; Value: 0.068; PartId: 10066; Supplier 1: Digi-Key; Supplier Part Number 1: CSR2512FK68L0-ND; ComponentLink1Description: Datasheet; ComponentLink1URL: http://www.seielect.com/catalog/SEI-CSR_CSRN.pdf; ComponentLink2Description: Digi-Key Listing; ComponentLink2URL: https://www.digikey.com/product-detail/en/stackpole-electronics-inc/CSR2512FK68L0/CSR2512FK68L0-ND/1742532; Tolerance: 1%; PowerRating: 2W; Price: 0.1665; Device Package: 2512 (6432 Metric)
footprint STACKPOLE CSR2512
pins: 1, 2

## CSR2512FK75L0
designator R?, comment 0.075
RES SMD 0.075 OHM 1% 2W 2512; Part Number: CSR2512FK75L0; Manufacturer: Stackpole Electronics Inc.; TemperatureRange: -55C ~ 155C; TemperatureCoefficient: 200ppm/C; Value: 0.075; PartId: 10067; Supplier 1: Digi-Key; Supplier Part Number 1: CSR2512FK75L0-ND; ComponentLink1Description: Datasheet; ComponentLink1URL: http://www.seielect.com/catalog/SEI-CSR_CSRN.pdf; ComponentLink2Description: Digi-Key Listing; ComponentLink2URL: https://www.digikey.com/product-detail/en/stackpole-electronics-inc/CSR2512FK75L0/CSR2512FK75L0-ND/1742536; Tolerance: 1%; PowerRating: 2W; Price: 0.1665; Device Package: 2512 (6432 Metric)
footprint STACKPOLE CSR2512
pins: 1, 2

## CSR2512FK80L0
designator R?, comment 0.08
RES SMD 0.08 OHM 1% 2W 2512; Part Number: CSR2512FK80L0; Manufacturer: Stackpole Electronics Inc.; TemperatureRange: -55C ~ 155C; TemperatureCoefficient: 200ppm/C; Value: 0.08; PartId: 10068; Supplier 1: Digi-Key; Supplier Part Number 1: CSR2512FK80L0-ND; ComponentLink1Description: Datasheet; ComponentLink1URL: http://www.seielect.com/catalog/SEI-CSR_CSRN.pdf; ComponentLink2Description: Digi-Key Listing; ComponentLink2URL: https://www.digikey.com/product-detail/en/stackpole-electronics-inc/CSR2512FK80L0/CSR2512FK80L0-ND/1742538; Tolerance: 1%; PowerRating: 2W; Price: 0.1665; Device Package: 2512 (6432 Metric)
footprint STACKPOLE CSR2512
pins: 1, 2

## CSR2512FK90L0
designator R?, comment 0.09
RES SMD 0.09 OHM 1% 2W 2512; Part Number: CSR2512FK90L0; Manufacturer: Stackpole Electronics Inc.; TemperatureRange: -55C ~ 155C; TemperatureCoefficient: 200ppm/C; Value: 0.09; PartId: 10069; Supplier 1: Digi-Key; Supplier Part Number 1: CSR2512FK90L0-ND; ComponentLink1Description: Datasheet; ComponentLink1URL: http://www.seielect.com/catalog/SEI-CSR_CSRN.pdf; ComponentLink2Description: Digi-Key Listing; ComponentLink2URL: https://www.digikey.com/product-detail/en/stackpole-electronics-inc/CSR2512FK90L0/CSR2512FK90L0-ND/1742540; Tolerance: 1%; PowerRating: 2W; Price: 0.1665; Device Package: 2512 (6432 Metric)
footprint STACKPOLE CSR2512
pins: 1, 2

## CSR2512FKR100
designator R?, comment 0.1
RES SMD 0.1 OHM 1% 2W 2512; Part Number: CSR2512FKR100; Manufacturer: Stackpole Electronics Inc.; TemperatureRange: -55C ~ 155C; TemperatureCoefficient: 200ppm/C; Value: 0.1; PartId: 10070; Supplier 1: Digi-Key; Supplier Part Number 1: CSR2512FKR100-ND; ComponentLink1Description: Datasheet; ComponentLink1URL: http://www.seielect.com/catalog/SEI-CSR_CSRN.pdf; ComponentLink2Description: Digi-Key Listing; ComponentLink2URL: https://www.digikey.com/product-detail/en/stackpole-electronics-inc/CSR2512FKR100/CSR2512FKR100-ND/1742542; Tolerance: 1%; PowerRating: 2W; Price: 0.1665; Device Package: 2512 (6432 Metric)
footprint STACKPOLE CSR2512
pins: 1, 2

## CSR2512FKR150
designator R?, comment 0.15